# Altium footprint library ADP_SMT.PcbLib: 204 footprints (part 5 of 15)
Each footprint in its own frame and in the unit in brackets; x right, y up, seen from the top. Pads: shape width x height; smd on the part's side, far side on the other; paste and mask are expansions set on the pad; w line width, h text height; cw(c..) or ccw(c..) is an arc to the next point about the centre after c.
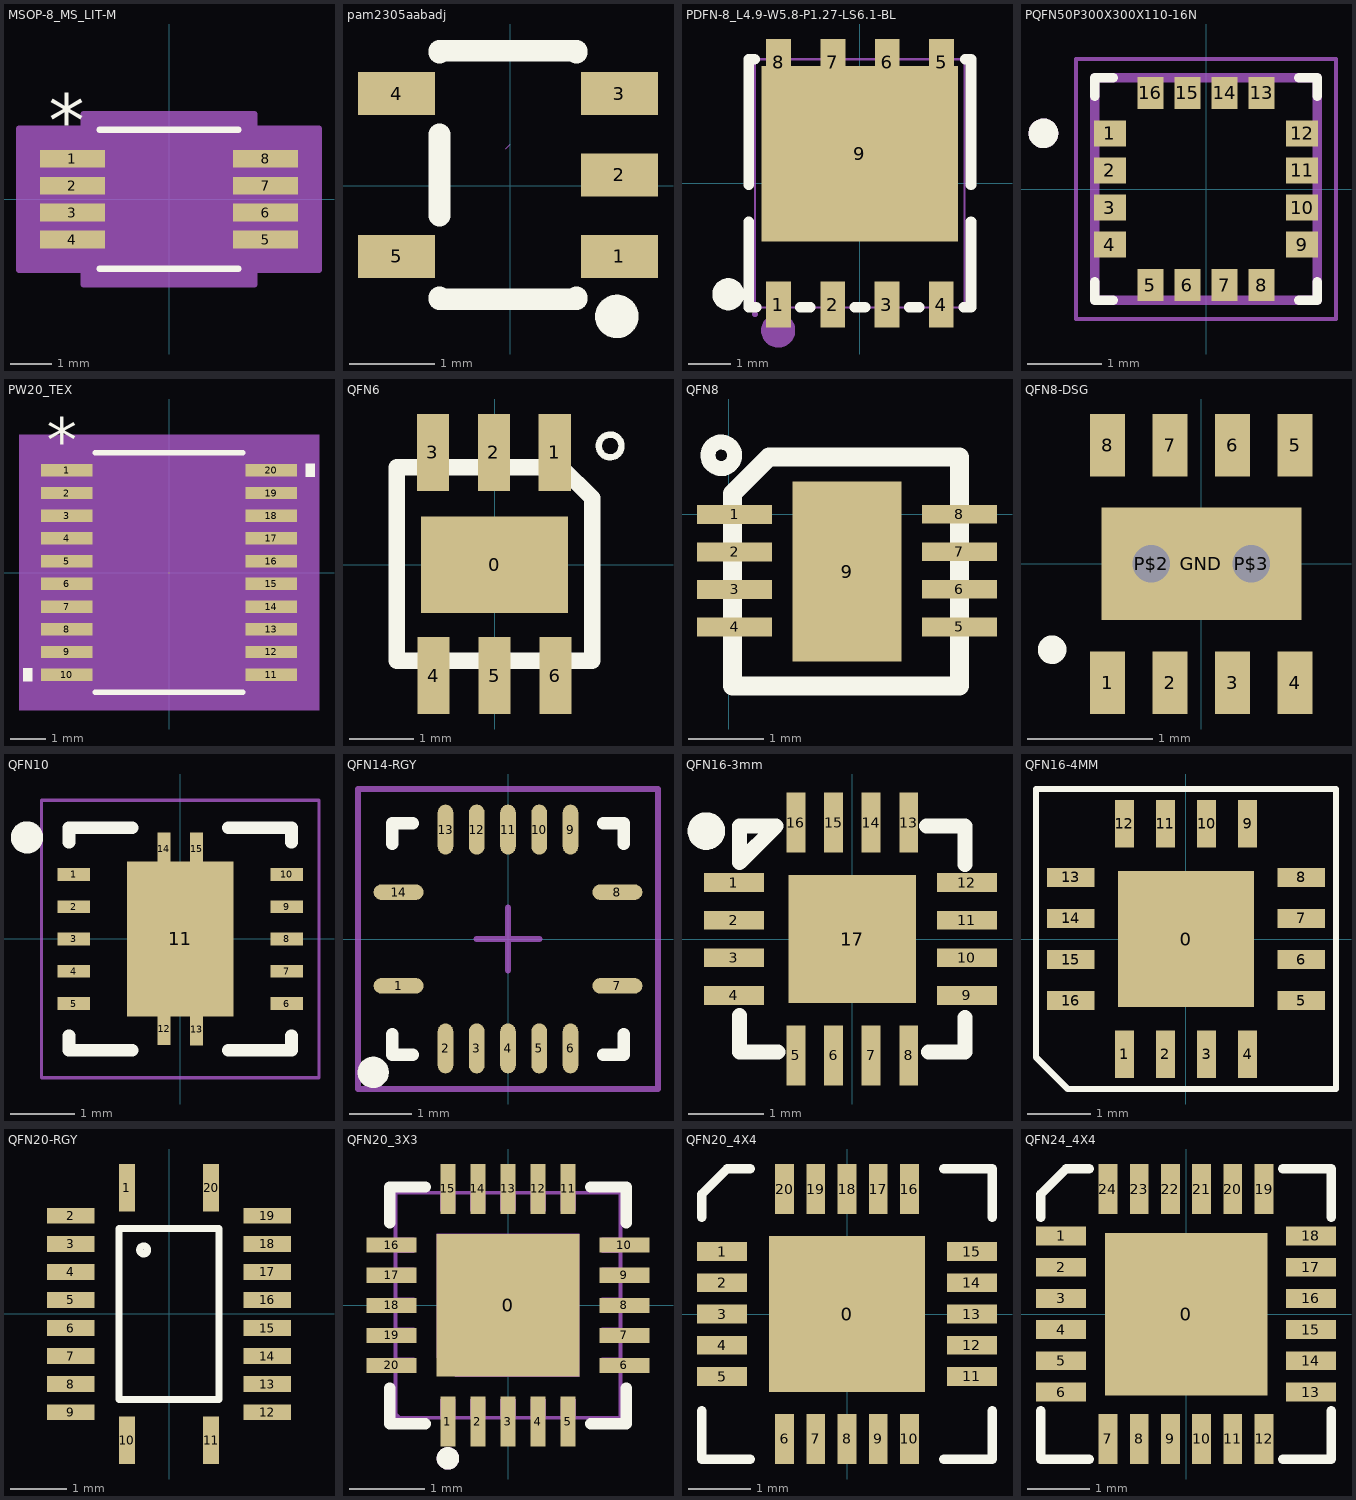
[diagram p4: the footprints below, top view; thin cyan lines are the x and y axes]

## MSOP-8_MS_LIT-M [mil]
pads (8):
  rect 61.5x17 smd paste+0 mask+0: 1(-91.75,38.39) 2(-91.75,12.8) 3(-91.75,-12.8) 4(-91.75,-38.39) 5(91.75,-38.39) 6(91.75,-12.8) 7(91.75,12.8) 8(91.75,38.39)
Top Overlay:
  lines w6: -66,-66 66,-66 ; -66,66 66,66
  text "*" at -114.25,50.39 h50
Mechanical 13:
  lines w0: -12,61 ccw(c0,61) 12,61
  lines w1: -100.5,-45.89 -61,-45.89 -61,-30.89 -100.5,-30.89 -100.5,-45.89 ; -100.5,-20.3 -61,-20.3 -61,-5.3 -100.5,-5.3 -100.5,-20.3 ; -100.5,5.3 -61,5.3 -61,20.3 -100.5,20.3 -100.5,5.3 ; -100.5,30.89 -61,30.89 -61,45.89 -100.5,45.89 -100.5,30.89 ; -61,-61 -61,61 61,61 61,-61 -61,-61 ; 61,-45.89 100.5,-45.89 100.5,-30.89 61,-30.89 61,-45.89 ; 61,-20.3 100.5,-20.3 100.5,-5.3 61,-5.3 61,-20.3 ; 61,5.3 100.5,5.3 100.5,20.3 61,20.3 61,5.3 ; 61,30.89 100.5,30.89 100.5,45.89 61,45.89 61,30.89
  text "*" at -58.5,8 h50
Mechanical 15:
  region: -81,-66.89 -142.5,-66.89 -142.5,66.89 -81,66.89 -81,81 81,81 81,66.89 142.5,66.89 142.5,-66.89 81,-66.89 81,-81 -81,-81
  lines w6: -142.5,-66.89 -81,-66.89 -81,-81 81,-81 81,-66.89 142.5,-66.89 142.5,66.89 81,66.89 81,81 -81,81 -81,66.89 -142.5,66.89 -142.5,-66.89
3D body "MSOP-8_MS_LIT.step": height 43.11, standoff 0, extent -100.51,-60.98 100.51,60.98

## pam2305aabadj [mm]
pads (5):
  rect 0.9x0.5 smd: 1(1.272,-0.823) 2(1.272,0.127) 3(1.272,1.077) 4(-1.328,1.077) 5(-1.328,-0.823)
Top Overlay:
  circle w0.254: c1.242,-1.524 r0.127
  lines w0.254: -0.828,-1.299 -0.828,-1.323 0.772,-1.323 0.772,-1.299 ; -0.828,-0.347 -0.828,0.601 ; -0.828,1.553 -0.828,1.577 0.772,1.577 0.772,1.553
Mechanical 15:
  lines w0.003: -0.053,0.432 -0.003,0.483

## PDFN-8_L4.9-W5.8-P1.27-LS6.1-BL [mm]
pads (9):
  rect 0.58x1.079 smd paste-100 mask+0.05: 1(-1.907,-2.835) 2(-0.637,-2.835) 3(0.633,-2.835) 4(1.903,-2.835)
  rect 0.58x1.08 smd paste-100 mask+0.05: 5(1.907,2.835) 6(0.638,2.835) 7(-0.632,2.835) 8(-1.902,2.835)
  rect 4.6x4.1 smd paste-100 mask+0.05: 9(-0.002,0.695)
Top Overlay:
  lines w0.25: -2.602,-0.897 -2.602,-2.895 -2.432,-2.895 ; -2.602,-0.032 -2.602,2.905 -2.465,2.905 -2.502,2.905 ; -1.393,-2.895 -1.162,-2.895 ; -0.123,-2.895 0.118,-2.895 ; 1.157,-2.895 1.388,-2.895 ; 2.427,-2.895 2.598,-2.895 2.598,-0.897 ; 2.498,2.905 2.46,2.905 2.598,2.905 2.598,-0.032
  lines w0.5: -3.202,-2.595 ccw(c-3.078,-2.594) -3.202,-2.592
Top Paste:
  region: -2.202,-2.29 -1.612,-2.29 -1.612,-3.38 -2.202,-3.38
  region: -0.932,-2.29 -0.342,-2.29 -0.342,-3.38 -0.932,-3.38
  region: 0.338,-2.29 0.928,-2.29 0.928,-3.38 0.338,-3.38
  region: 1.608,-2.29 2.198,-2.29 2.198,-3.38 1.608,-3.38
  region: -2.192,3.374 -1.613,3.374 -1.613,2.744 -0.923,2.744 -0.923,3.374 -0.343,3.374 -0.343,2.744 0.348,2.744 0.348,3.375 0.928,3.375 0.928,2.745 1.618,2.745 1.618,3.374 1.619,3.375 2.197,3.375 2.197,2.745 2.297,2.745 2.297,-1.355 -2.302,-1.355 -2.302,2.745 -2.193,2.745
Mechanical 6:
  circle w0.4: c-1.913,-3.44 r0.2
Mechanical 15:
  region: -2.393,-3.06 -2.393,-3.036 -2.428,-3 -2.477,-3 -2.513,-3.036 -2.513,-3.06 -2.513,-3.085 -2.477,-3.12 -2.428,-3.12 -2.393,-3.085 -2.393,-3.06
  region: -1.707,-3.06 -2.107,-3.06 -2.107,-2.51 -1.707,-2.51
  region: -0.437,-3.06 -0.837,-3.06 -0.837,-2.51 -0.437,-2.51
  region: 0.833,-3.06 0.433,-3.06 0.433,-2.51 0.833,-2.51
  region: 2.103,-3.06 1.703,-3.06 1.703,-2.51 2.103,-2.51
  region: -2.177,2.361 2.173,2.361 2.173,-1.305 -2.177,-1.305
  region: -2.102,3.035 -1.702,3.035 -1.702,2.355 -2.102,2.355
  region: -0.832,3.035 -0.432,3.035 -0.432,2.355 -0.832,2.355
  region: 0.438,3.035 0.838,3.035 0.838,2.355 0.438,2.355
  region: 1.707,3.035 2.107,3.035 2.107,2.355 1.707,2.355
  lines w0.051: -2.452,-2.9 -2.452,2.9 2.448,2.9 2.448,-2.9 -2.452,-2.9

## PQFN50P300X300X110-16N [mm]
pads (16):
  rect 0.43x0.35 smd: 1(-1.295,0.75) 2(-1.295,0.25) 3(-1.295,-0.25) 4(-1.295,-0.75) 9(1.295,-0.75) 10(1.295,-0.25) 11(1.295,0.25) 12(1.295,0.75)
  rect 0.35x0.43 smd: 5(-0.75,-1.295) 6(-0.25,-1.295) 7(0.25,-1.295) 8(0.75,-1.295) 13(0.75,1.295) 14(0.25,1.295) 15(-0.25,1.295) 16(-0.75,1.295)
Top Overlay:
  circle w0.2: c-2.19,0.75 r0.1
  lines w0.127: -1.5,-1.25 -1.5,-1.5 -1.25,-1.5 ; -1.5,1.25 -1.5,1.5 -1.25,1.5 ; 1.25,-1.5 1.5,-1.5 1.5,-1.25 ; 1.25,1.5 1.5,1.5 1.5,1.25
Mechanical 13:
  circle w0.2: c-2.19,0.75 r0.1
  lines w0.127: -1.5,-1.5 1.5,-1.5 1.5,1.5 -1.5,1.5 -1.5,-1.5
Mechanical 15:
  lines w0.05: -1.75,-1.75 1.75,-1.75 1.75,1.75 -1.75,1.75 -1.75,-1.75

## PW20_TEX [mil]
pads (20):
  rect 58x14 smd paste+0 mask+0: 1(-115,115.16) 2(-115,89.57) 3(-115,63.98) 4(-115,38.39) 5(-115,12.8) 6(-115,-12.8) 7(-115,-38.39) 8(-115,-63.98) 9(-115,-89.57) 10(-115,-115.16) 11(115,-115.16) 12(115,-89.57) 13(115,-63.98) 14(115,-38.39) 15(115,-12.8) 16(115,12.8) 17(115,38.39) 18(115,63.98) 19(115,89.57) 20(115,115.16)
Top Overlay:
  region: 154,122.66 164,122.66 164,107.66 154,107.66
  region: -154,-107.66 -164,-107.66 -164,-122.66 -154,-122.66
  lines w6: -83.42,-135 83.42,-135 ; -83.42,135 83.42,135
  text "*" at -137.5,124.16 h50
Mechanical 5:
  region: 169,-155 -169,-155 -169,155 169,155
Mechanical 13:
  lines w0: -12,130 ccw(c0,130) 12,130
  lines w1: -130,-121.16 -88.5,-121.16 -88.5,-109.16 -130,-109.16 -130,-121.16 ; -130,-95.57 -88.5,-95.57 -88.5,-83.57 -130,-83.57 -130,-95.57 ; -130,-69.98 -88.5,-69.98 -88.5,-57.98 -130,-57.98 -130,-69.98 ; -130,-44.39 -88.5,-44.39 -88.5,-32.39 -130,-32.39 -130,-44.39 ; -130,-18.8 -88.5,-18.8 -88.5,-6.8 -130,-6.8 -130,-18.8 ; -130,6.8 -88.5,6.8 -88.5,18.8 -130,18.8 -130,6.8 ; -130,32.39 -88.5,32.39 -88.5,44.39 -130,44.39 -130,32.39 ; -130,57.98 -88.5,57.98 -88.5,69.98 -130,69.98 -130,57.98 ; -130,83.57 -88.5,83.57 -88.5,95.57 -130,95.57 -130,83.57 ; -130,109.16 -88.5,109.16 -88.5,121.16 -130,121.16 -130,109.16 ; -88.5,-130 -88.5,130 88.5,130 88.5,-130 -88.5,-130 ; 88.5,-121.16 130,-121.16 130,-109.16 88.5,-109.16 88.5,-121.16 ; 88.5,-95.57 130,-95.57 130,-83.57 88.5,-83.57 88.5,-95.57 ; 88.5,-69.98 130,-69.98 130,-57.98 88.5,-57.98 88.5,-69.98 ; 88.5,-44.39 130,-44.39 130,-32.39 88.5,-32.39 88.5,-44.39 ; 88.5,-18.8 130,-18.8 130,-6.8 88.5,-6.8 88.5,-18.8 ; 88.5,6.8 130,6.8 130,18.8 88.5,18.8 88.5,6.8 ; 88.5,32.39 130,32.39 130,44.39 88.5,44.39 88.5,32.39 ; 88.5,57.98 130,57.98 130,69.98 88.5,69.98 88.5,57.98 ; 88.5,83.57 130,83.57 130,95.57 88.5,95.57 88.5,83.57 ; 88.5,109.16 130,109.16 130,121.16 88.5,121.16 88.5,109.16
  text "*" at -86,77 h50
Mechanical 15:
  region: -98.5,-132.16 -154,-132.16 -154,132.16 -98.5,132.16 -98.5,140 98.5,140 98.5,132.16 154,132.16 154,-132.16 98.5,-132.16 98.5,-140 -98.5,-140
  lines w6: -154,-132.16 -98.5,-132.16 -98.5,-140 98.5,-140 98.5,-132.16 154,-132.16 154,132.16 98.5,132.16 98.5,140 -98.5,140 -98.5,132.16 -154,132.16 -154,-132.16
3D body "PW20_TEX.step": height 47.09, standoff 0, extent -130,-130 130,130

## QFN6 [mm] "SOT-23/SC-74A; 5 Leads; Body 3.1 x 3 mm, inc. leads (LxW max)"
height 1.45
pads (7):
  rect 2.3x1.5 smd: 0(0,0)
  rect 0.5x1.2 smd: 1(0.94,1.753) 2(-0.01,1.753) 3(-0.96,1.753) 4(-0.95,-1.727) 5(0,-1.727) 6(0.95,-1.727)
Top Overlay:
  circle w0.1: c1.804,1.854 r0.177
  lines w0.254: -1.524,-1.499 1.524,-1.499 1.524,1.041 1.041,1.524 -1.524,1.524 -1.524,-1.499
3D body: height 1, standoff 0, extent -1.524,-1.499 1.524,1.524

## QFN8 [mm] "SOT-23/SC-74A; 5 Leads; Body 3.1 x 3 mm, inc. leads (LxW max)"
height 1.45
pads (9):
  rect 1x0.25 smd: 1(0.076,0) 2(0.076,-0.5) 3(0.076,-1) 5(3.073,-1.499) 6(3.073,-0.999) 7(3.073,-0.499) 8(3.073,0.001)
  rect 1x0.25 smd paste+0: 4(0.076,-1.5)
  rect 1.45x2.4 smd: 9(1.575,-0.762)
Top Overlay:
  circle w0.2: c-0.101,0.787 r0.177
  lines w0.254: 0.051,-2.286 3.073,-2.286 3.073,0.762 0.533,0.762 0.051,0.279 0.051,-2.286
3D body: height 1, standoff 0, extent 0.051,-2.286 3.073,0.762

## QFN8-DSG [mm]
pads (11):
  rect 0.28x0.5 smd: 1(-0.75,-0.95) 2(-0.25,-0.95) 3(0.25,-0.95) 4(0.75,-0.95) 5(0.75,0.95) 6(0.25,0.95) 7(-0.25,0.95) 8(-0.75,0.95)
  rect 1.6x0.9 smd: GND(0,0)
  rect 0.55x0.55 hole 0.3: P$2(-0.4,0) P$3(0.4,0)
Top Overlay:
  circle w0.127: c-1.194,-0.686 r0.051
3D body "User Library-DSG (S-PWSON-N8).step": height 0.76, standoff -0.04, extent -1.05,-1.041 1.05,1.059

## QFN10 [mm] "QFN, 14-Leads, Body 3.00x3.00mm, Pitch 0.50mm, Thermal Pad 1.63x2.40mm, IPC Medium Density"
height 1
pads (15):
  rect 0.5x0.2 smd: 1(-1.65,1) 2(-1.65,0.5) 3(-1.65,0) 4(-1.65,-0.5) 5(-1.65,-1) 6(1.65,-1) 7(1.65,-0.5) 8(1.65,0) 9(1.65,0.5) 10(1.65,1)
  rect 1.65x2.4 smd: 11(0,0)
  rect 0.2x0.5 smd: 12(-0.25,-1.392) 13(0.254,-1.397) 14(-0.254,1.397) 15(0.254,1.397)
Top Overlay:
  circle w0.25: c-2.375,1.575 r0.125
  lines w0.2: -1.725,-1.5 -1.725,-1.725 -0.75,-1.725 ; -1.725,1.5 -1.725,1.725 -0.75,1.725 ; 0.75,-1.725 1.725,-1.725 1.725,-1.5 ; 0.75,1.725 1.725,1.725 1.725,1.5
Mechanical 15:
  lines w0.05: -2.15,-2.15 2.15,-2.15 2.15,2.15 -2.15,2.15 -2.15,-2.15
  lines w0.1: -0.5,0 0.5,0 ; 0,-0.5 0,0.5
3D body: height 1, standoff 0.05, extent -1.575,-1.575 1.575,1.575
3D body: height 0.2, standoff 0.05, extent 0.152,-1.6 0.33,-1.397
3D body: height 0.2, standoff 0.05, extent -0.343,-1.6 -0.165,-1.397
3D body: height 0.2, standoff 0.05, extent 0.152,1.397 0.33,1.6
3D body: height 0.2, standoff 0.05, extent -0.356,1.397 -0.178,1.6
3D body: height 0.2, standoff 0.05, extent 1.397,-1.092 1.6,-0.914
3D body: height 0.2, standoff 0.05, extent 1.397,-0.584 1.6,-0.406
3D body: height 0.2, standoff 0.05, extent 1.397,-0.076 1.6,0.102
3D body: height 0.2, standoff 0.05, extent 1.397,0.406 1.6,0.584
3D body: height 0.2, standoff 0.05, extent 1.397,0.914 1.6,1.092
3D body: height 0.2, standoff 0.05, extent -1.6,0.914 -1.397,1.092
3D body: height 0.2, standoff 0.05, extent -1.6,0.406 -1.397,0.584
3D body: height 0.2, standoff 0.05, extent -1.6,-0.102 -1.397,0.076
3D body: height 0.2, standoff 0.05, extent -1.6,-0.584 -1.397,-0.406
3D body: height 0.2, standoff 0.05, extent -1.6,-1.092 -1.397,-0.914

## QFN14-RGY [mm] "QFN14-RGY (LIB+=TXS0104E)"
height 1
pads (14):
  oval 0.8x0.25 smd: 1(-1.75,-0.75) 7(1.75,-0.75) 8(1.75,0.75) 14(-1.75,0.75)
  oval 0.25x0.8 smd: 2(-1,-1.75) 3(-0.5,-1.75) 4(0,-1.75) 5(0.5,-1.75) 6(1,-1.75) 9(1,1.75) 10(0.5,1.75) 11(0,1.75) 12(-0.5,1.75) 13(-1,1.75)
Top Overlay:
  circle w0.25: c-2.157,-2.134 r0.125
  lines w0.2: -1.85,-1.525 -1.85,-1.85 -1.525,-1.85 ; -1.85,1.525 -1.85,1.85 -1.525,1.85 ; 1.525,-1.85 1.85,-1.85 1.85,-1.525 ; 1.525,1.85 1.85,1.85 1.85,1.525
Mechanical 15:
  lines w0.1: -0.5,0 0.5,0 ; 0,-0.5 0,0.5 ; -2.4,-2.4 2.4,-2.4 2.4,2.4 -2.4,2.4 -2.4,-2.4
3D body "User Library-QFN-14_Therm.STEP": height 1, standoff 0, extent -1.753,-1.753 1.747,1.747

## QFN16-3mm [mm] "QFN, 16-Leads, Body 3.0x3.0mm (max), Pitch 0.50mm, IPC Low Density"
height 3
pads (17):
  rect 0.8x0.25 smd: 1(-1.575,0.75) 2(-1.575,0.25) 3(-1.575,-0.25) 4(-1.575,-0.75) 9(1.524,-0.75) 10(1.524,-0.25) 11(1.524,0.25) 12(1.524,0.75)
  rect 0.25x0.8 smd: 5(-0.75,-1.55) 6(-0.25,-1.55) 7(0.25,-1.55) 8(0.75,-1.55) 13(0.75,1.55) 14(0.25,1.55) 15(-0.25,1.55) 16(-0.75,1.55)
  rect 1.7x1.7 smd: 17(0,0)
Top Overlay:
  circle w0.25: c-1.941,1.436 r0.125
  lines w0.2: -1.5,-1.015 -1.5,-1.5 -0.989,-1.5 ; 0.989,1.5 1.5,1.5 1.5,0.989 ; 1.016,-1.5 1.5,-1.5 1.5,-1.041 ; -1.5,1.016 -1.016,1.5 -1.5,1.5 -1.5,1.016
3D body "QFN-16_3x3.STEP": height 0.9, standoff 0, extent -1.549,-1.521 1.493,1.521

## QFN16-4MM [mm] "LNA"
height 5.33
pads (17):
  rect 2.15x2.15 smd: 0(0,0)
  rect 0.3x0.75 smd: 1(-0.975,-1.825) 2(-0.325,-1.825) 3(0.325,-1.825) 4(0.975,-1.825) 9(0.975,1.825) 10(0.325,1.825) 11(-0.325,1.825) 12(-0.975,1.825)
  rect 0.75x0.3 smd: 5(1.825,-0.975) 6(1.825,-0.325) 7(1.825,0.325) 8(1.825,0.975) 13(-1.825,0.975) 14(-1.825,0.325) 15(-1.825,-0.325) 16(-1.825,-0.975)
Top Overlay:
  lines w0.1: -1.025,2.375 2.375,2.375 2.375,-2.375 -1.525,-2.375 -1.875,-2.375 -2.375,-1.875 -2.375,-1.425 -2.375,2.375 -0.4,2.375
3D body "QFN16.step": height 0.85, standoff 0, extent -2.001,-1.981 2.001,2.021

## QFN20-RGY [mm]
pads (20):
  rect 0.28x0.85 smd: 1(-0.75,2.25) 10(-0.75,-2.25) 11(0.75,-2.25) 20(0.75,2.25)
  rect 0.85x0.28 smd: 2(-1.75,1.75) 3(-1.75,1.25) 4(-1.75,0.75) 5(-1.75,0.25) 6(-1.75,-0.25) 7(-1.75,-0.75) 8(-1.75,-1.25) 9(-1.75,-1.75) 12(1.75,-1.75) 13(1.75,-1.25) 14(1.75,-0.75) 15(1.75,-0.25) 16(1.75,0.25) 17(1.75,0.75) 18(1.75,1.25) 19(1.75,1.75)
Top Overlay:
  circle w0.127: c-0.452,1.143 r0.071
  lines w0.127: -0.889,-1.524 0.889,-1.524 0.889,1.524 -0.889,1.524 -0.889,-1.524
3D body "User Library-DHVQFN20.STEP": height 1, standoff 0, extent -1.22,-2.26 1.3,2.26

## QFN20_3X3 [mm] "L3.0-W3.0-P0.40-BL-EP1.9"
pads (21):
  rect 1.9x1.9 smd paste+0 mask+0.05: 0(0,0)
  rect 0.2x0.665 smd paste+0 mask+0.05: 1(-0.8,-1.55) 2(-0.4,-1.55) 3(0,-1.55) 4(0.4,-1.55) 5(0.8,-1.55) 11(0.8,1.55) 12(0.4,1.55) 13(0,1.55) 14(-0.4,1.55) 15(-0.8,1.55)
  rect 0.665x0.2 smd paste+0 mask+0.05: 6(1.55,-0.8) 7(1.55,-0.4) 8(1.55,0) 9(1.55,0.4) 10(1.55,0.8) 16(-1.55,0.8) 17(-1.55,0.4) 18(-1.55,0) 19(-1.55,-0.4) 20(-1.55,-0.8)
Top Overlay:
  circle w0.15: c-0.8,-2.04 r0.075
  lines w0.152: -1.576,-1.103 -1.576,-1.576 -1.103,-1.576 ; -1.576,1.103 -1.576,1.576 -1.103,1.576 ; 1.103,-1.576 1.576,-1.576 1.576,-1.103 ; 1.103,1.576 1.576,1.576 1.576,1.103
Mechanical 6:
  circle w0.15: c-0.8,-2.04 r0.075
Mechanical 15:
  region: -1.44,-1.5 -1.44,-1.475 -1.475,-1.44 -1.525,-1.44 -1.56,-1.475 -1.56,-1.5 -1.56,-1.525 -1.525,-1.56 -1.475,-1.56 -1.44,-1.525 -1.44,-1.5
  region: -0.95,-0.7 -0.95,0.95 0.95,0.95 0.95,-0.95 -0.7,-0.95
  region: -1.5,-0.9 -1.5,-0.7 -1.25,-0.7 -1.25,-0.9
  region: -1.5,-0.5 -1.5,-0.3 -1.25,-0.3 -1.25,-0.5
  region: -1.5,-0.1 -1.5,0.1 -1.25,0.1 -1.25,-0.1
  region: -1.5,0.3 -1.5,0.5 -1.25,0.5 -1.25,0.3
  region: -1.5,0.7 -1.5,0.9 -1.25,0.9 -1.25,0.7
  region: -0.9,1.25 -0.9,1.5 -0.7,1.5 -0.7,1.25
  region: -0.5,1.25 -0.5,1.5 -0.3,1.5 -0.3,1.25
  region: -0.1,1.25 -0.1,1.5 0.1,1.5 0.1,1.25
  region: 0.3,1.25 0.3,1.5 0.5,1.5 0.5,1.25
  region: 0.7,1.25 0.7,1.5 0.9,1.5 0.9,1.25
  region: 1.25,0.7 1.25,0.9 1.5,0.9 1.5,0.7
  region: 1.25,0.3 1.25,0.5 1.5,0.5 1.5,0.3
  region: 1.25,-0.1 1.25,0.1 1.5,0.1 1.5,-0.1
  region: 1.25,-0.5 1.25,-0.3 1.5,-0.3 1.5,-0.5
  region: 1.25,-0.9 1.25,-0.7 1.5,-0.7 1.5,-0.9
  region: 0.7,-1.5 0.7,-1.25 0.9,-1.25 0.9,-1.5
  region: 0.3,-1.5 0.3,-1.25 0.5,-1.25 0.5,-1.5
  region: -0.1,-1.5 -0.1,-1.25 0.1,-1.25 0.1,-1.5
  region: -0.5,-1.5 -0.5,-1.25 -0.3,-1.25 -0.3,-1.5
  region: -0.9,-1.5 -0.9,-1.25 -0.7,-1.25 -0.7,-1.5
  lines w0.051: -1.5,-1.5 -1.5,1.5 1.5,1.5 1.5,-1.5 -1.5,-1.5

## QFN20_4X4 [mm]
pads (21):
  rect 2.5x2.5 smd: 0(0,0)
  rect 0.8x0.3 smd: 1(-2,1) 2(-2,0.5) 3(-2,0) 4(-2,-0.5) 5(-2,-1) 11(2,-1) 12(2,-0.5) 13(2,0) 14(2,0.5) 15(2,1)
  rect 0.3x0.8 smd: 6(-1,-2) 7(-0.5,-2) 8(0,-2) 9(0.5,-2) 10(1,-2) 16(1,2) 17(0.5,2) 18(0,2) 19(-0.5,2) 20(-1,2)
Top Overlay:
  lines w0.15: -2.325,-1.55 -2.325,-2.325 -1.55,-2.325 ; -2.325,1.55 -2.325,1.917 -1.917,2.325 -1.55,2.325 ; 1.55,-2.325 2.325,-2.325 2.325,-1.55 ; 1.55,2.325 2.325,2.325 2.325,1.55
3D body "QFN-20.STEP": height 0.62, standoff -0.08, extent -1.501,-1.5 1.499,1.5

## QFN24_4X4 [mm]
pads (25):
  rect 2.6x2.6 smd: 0(0.005,0)
  rect 0.8x0.3 smd: 1(-2,1.25) 2(-2,0.75) 3(-2,0.25) 4(-2,-0.25) 5(-2,-0.75) 6(-2,-1.25) 13(2,-1.25) 14(2,-0.75) 15(2,-0.25) 16(2,0.25) 17(2,0.75) 18(2,1.25)
  rect 0.3x0.8 smd: 7(-1.25,-2) 8(-0.75,-2) 9(-0.25,-2) 10(0.25,-2) 11(0.75,-2) 12(1.25,-2) 19(1.25,2) 20(0.75,2) 21(0.25,2) 22(-0.25,2) 23(-0.75,2) 24(-1.25,2)
Top Overlay:
  lines w0.15: -2.325,-1.55 -2.325,-2.325 -1.55,-2.325 ; -2.325,1.55 -2.325,1.917 -1.917,2.325 -1.55,2.325 ; 1.55,-2.325 2.325,-2.325 2.325,-1.55 ; 1.55,2.325 2.325,2.325 2.325,1.55
3D body "QFN24.step": height 0.9, standoff 0, extent -1.997,-2.002 2.007,2.002